# Altium footprint library ZJUDancer_Circuit_V3.6.3.PcbLib: 35 footprints (part 2 of 3)
Each footprint in its own frame and in the unit in brackets; x right, y up, seen from the top. Pads: shape width x height; smd on the part's side, far side on the other; paste and mask are expansions set on the pad; w line width, h text height; cw(c..) or ccw(c..) is an arc to the next point about the centre after c.
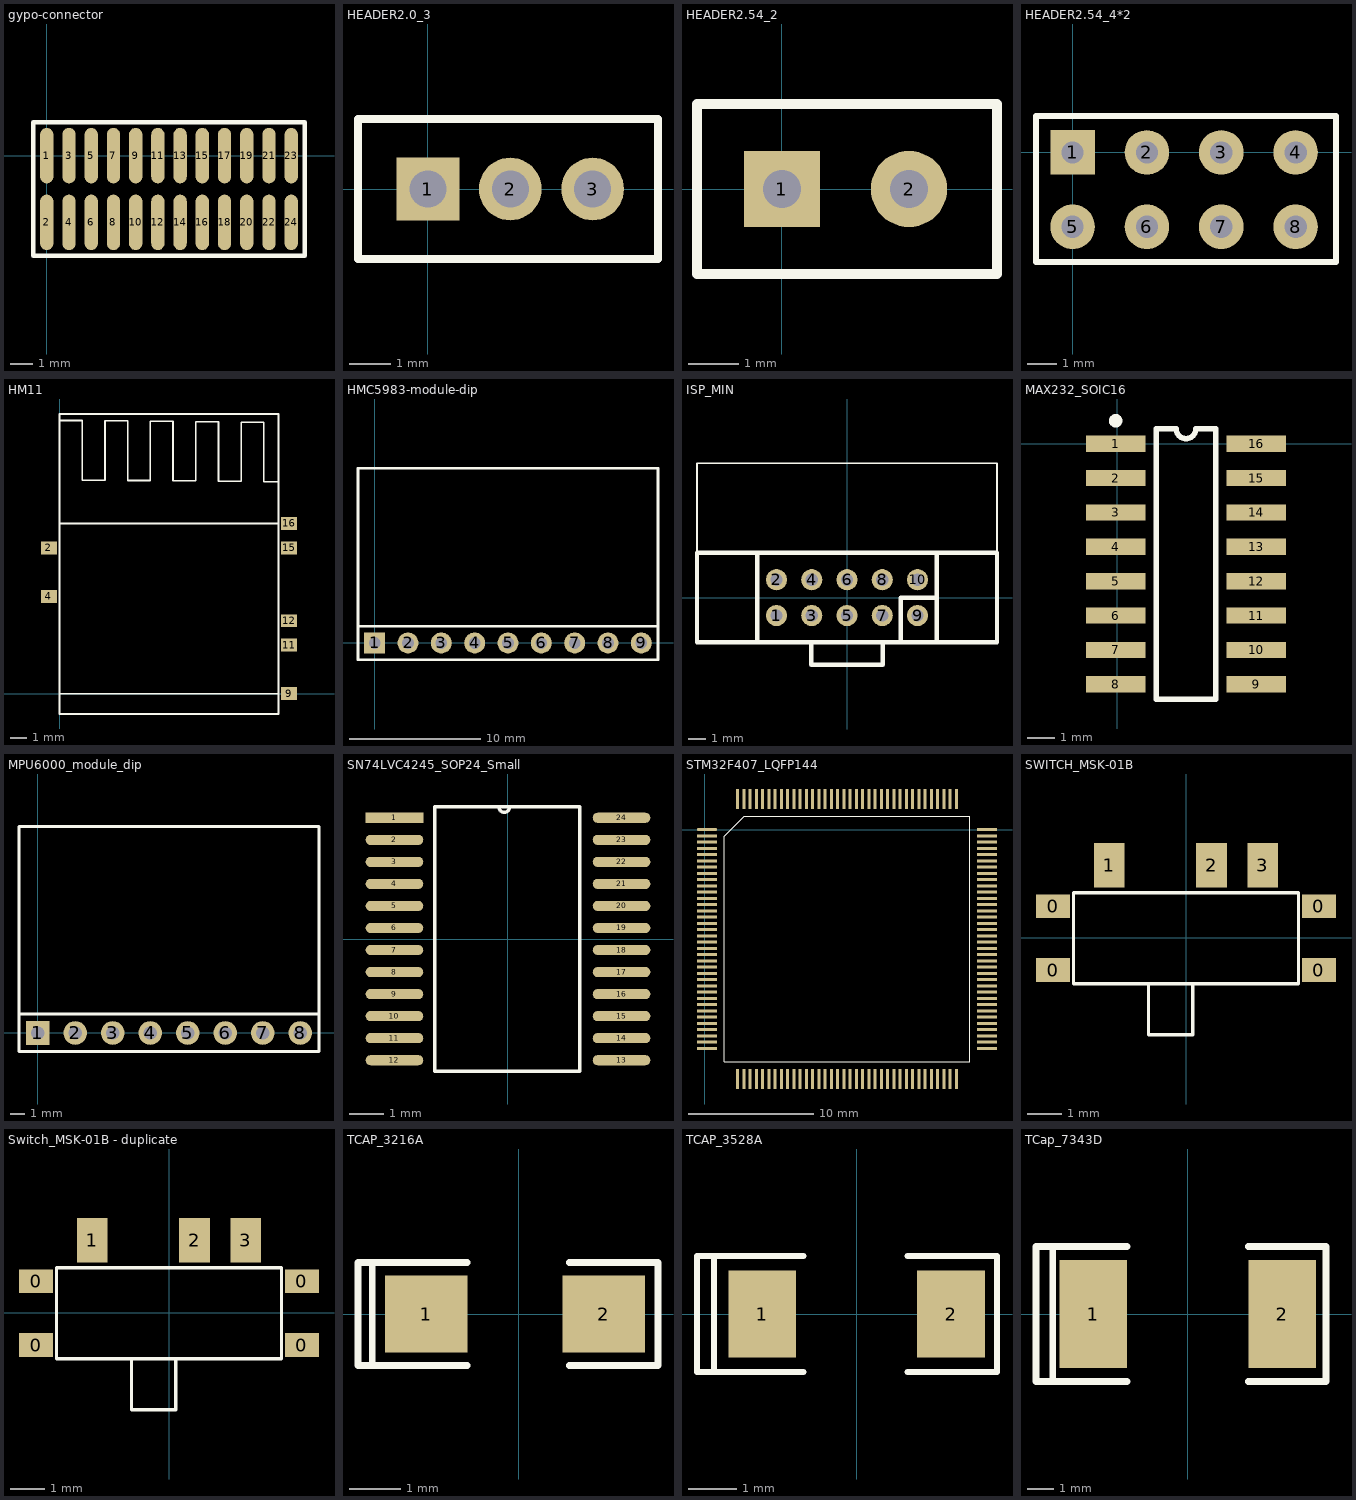
[diagram p1: the footprints below, top view; thin cyan lines are the x and y axes]

## gypo-connector [mm]
pads (24):
  oval 0.6x2.5 smd: 1(0,0) 2(0,-3) 3(1,0) 4(1,-3) 5(2,0) 6(2,-3) 7(3,0) 8(3,-3) 9(4,0) 10(4,-3) 11(5,0) 12(5,-3) 13(6,0) 14(6,-3) 15(7,0) 16(7,-3) 17(8,0) 18(8,-3) 19(9,0) 20(9,-3) 21(10,0) 22(10,-3) 23(11,0) 24(11,-3)
Top Overlay:
  lines w0.2: -0.6,-4.5 11.6,-4.5 11.6,1.5 -0.6,1.5 -0.6,-4.5

## HEADER2.0_3 [mil]
pads (3):
  rect 60x60 hole 35.43: 1(0,0)
  round 60 hole 35.43: 2(78.74,0) 3(157.48,0)
Top Overlay:
  lines w7.87: -66.93,-66.93 -66.93,66.93 220,66.93 220,-66.93 -66.93,-66.93

## HEADER2.54_2 [mil]
pads (2):
  rect 60x60 hole 30: 1(0,0)
  round 60 hole 30: 2(100,0)
Top Overlay:
  lines w7.87: -66.93,-66.93 169.29,-66.93 169.29,66.93 -66.93,66.93 -66.93,-66.93

## HEADER2.54_4*2 [mil]
pads (8):
  rect 60x60 hole 30: 1(0,0)
  round 60 hole 30: 2(100,0) 3(200,0) 4(300,0) 5(0,-100) 6(100,-100) 7(200,-100) 8(300,-100)
Top Overlay:
  lines w7.87: -49.21,-147.64 354.33,-147.64 354.33,49.21 344.49,49.21 -49.21,49.21 -49.21,-147.64

## HM11 [mm]
pads (7):
  rect 1x0.8 smd: 2(-0.65,9) 4(-0.65,6) 9(14.15,0) 11(14.15,3) 12(14.15,4.5) 15(14.15,9) 16(14.15,10.5)
Top Overlay:
  lines w0.1: 0,10.5 13.5,10.5 ; 0,16.85 1.4,16.85 1.4,13.175 2.8,13.175 2.8,16.825 4.2,16.825 4.2,13.15 5.6,13.15 5.6,16.8 7,16.8 7,13.125 8.4,13.125 8.4,16.775 9.8,16.775 9.8,13.1 11.2,13.1 11.2,16.75 12.6,16.75 12.6,13.075 13.5,13.075 ; 13.5,0 0,0 ; 0,0 0,17.25 13.5,17.25 13.5,-1.25 0,-1.25 0,0
3D body: height 1.63, standoff 0.02, extent 0,-1.25 13.5,17.25

## HMC5983-module-dip [mm]
pads (9):
  rect 1.6x1.6 hole 0.9: 1(0,0)
  round 1.6 hole 0.9: 2(2.54,0) 3(5.08,0) 4(7.62,0) 5(10.16,0) 6(12.7,0) 7(15.24,0) 8(17.78,0) 9(20.32,0)
Top Overlay:
  lines w0.2: -1.27,1.27 -1.27,13.3 21.59,13.3 21.59,1.27 ; -1.27,1.27 21.59,1.27 ; -1.27,1.27 -1.27,-1.27 21.59,-1.27 21.59,1.27

## ISP_MIN [mm]
pads (10):
  round 1.2 hole 0.7: 1(-4,-1.016) 2(-4,1.016) 3(-2,-1.016) 4(-2,1.016) 5(0,-1.016) 6(0,1.016) 7(2,-1.016) 8(2,1.016) 9(4,-1.016) 10(4,1.016)
Top Overlay:
  lines w0.1: -8.509,2.54 -8.509,7.625 8.509,7.625 8.509,2.54
  lines w0.254: -5.08,-2.54 -5.08,2.54 ; -2.032,-2.54 -2.032,-3.81 2.032,-3.81 2.032,-2.54 ; 3.048,-2.54 3.048,0 5.08,0 ; 5.08,-2.54 5.08,2.54 ; -8.509,-2.54 -8.509,2.54 8.509,2.54 8.509,-2.54 -8.509,-2.54
3D body: height 5.42, standoff -2.68, extent -8.605,-1.223 8.595,7.627

## MAX232_SOIC16 [mm]
pads (16):
  rect 2.2x0.6 smd: 1(-0.06,0) 2(-0.06,-1.27) 3(-0.06,-2.54) 4(-0.06,-3.81) 5(-0.06,-5.08) 6(-0.06,-6.35) 7(-0.06,-7.62) 8(-0.06,-8.89) 9(5.14,-8.89) 10(5.14,-7.62) 11(5.14,-6.35) 12(5.14,-5.08) 13(5.14,-3.81) 14(5.14,-2.54) 15(5.14,-1.27) 16(5.14,0)
Top Overlay:
  circle w0.25: c-0.06,0.85 r0.125
  lines w0.2: 1.44,-9.445 3.64,-9.445 3.64,0.555 2.907,0.555 cw(c2.54,0.555) 2.173,0.555 1.44,0.555 1.44,-9.445
3D body: height 1.64, standoff -0.01, extent -0.449,-9.396 5.551,0.504

## MPU6000_module_dip [mm]
pads (8):
  rect 1.6x1.6 hole 0.9: 1(0,0)
  round 1.6 hole 0.9: 2(2.54,0) 3(5.08,0) 4(7.62,0) 5(10.16,0) 6(12.7,0) 7(15.24,0) 8(17.78,0)
Top Overlay:
  lines w0.2: -1.27,1.27 19.05,1.27 ; -1.27,1.27 -1.27,-1.27 19.05,-1.27 19.05,1.27 ; -1.27,1.27 -1.27,14 19.05,14 19.05,1.27

## SN74LVC4245_SOP24_Small [mm]
pads (24):
  rect 1.7x0.3 smd: 1(-3.35,3.575)
  oval 1.7x0.3 smd: 2(-3.35,2.925) 3(-3.35,2.275) 4(-3.35,1.625) 5(-3.35,0.975) 6(-3.35,0.325) 7(-3.35,-0.325) 8(-3.35,-0.975) 9(-3.35,-1.625) 10(-3.35,-2.275) 11(-3.35,-2.925) 12(-3.35,-3.575) 13(3.35,-3.575) 14(3.35,-2.925) 15(3.35,-2.275) 16(3.35,-1.625) 17(3.35,-0.975) 18(3.35,-0.325) 19(3.35,0.325) 20(3.35,0.975) 21(3.35,1.625) 22(3.35,2.275) 23(3.35,2.925) 24(3.35,3.575)
Top Overlay:
  lines w0.1: -0.272,3.899 ccw(c-0.11,3.9) 0.053,3.9 ; -2.16,-3.9 2.12,-3.9 2.12,3.9 -2.16,3.9 -2.16,-3.9
3D body: height 0.95, standoff 0, extent -3.21,-3.905 3.19,3.895

## STM32F407_LQFP144 [mm]
pads (144):
  oval 1.6x0.254 smd: 1(0.2,0)
  rect 1.6x0.254 smd: 2(0.2,-0.5) 3(0.2,-1) 4(0.2,-1.5) 5(0.2,-2) 6(0.2,-2.5) 7(0.2,-3) 8(0.2,-3.5) 9(0.2,-4) 10(0.2,-4.5) 11(0.2,-5) 12(0.2,-5.5) 13(0.2,-6) 14(0.2,-6.5) 15(0.2,-7) 16(0.2,-7.5) 17(0.2,-8) 18(0.2,-8.5) 19(0.2,-9) 20(0.2,-9.5) 21(0.2,-10) 22(0.2,-10.5) 23(0.2,-11) 24(0.2,-11.5) 25(0.2,-12) 26(0.2,-12.5) 27(0.2,-13) 28(0.2,-13.5) 29(0.2,-14) 30(0.2,-14.5) 31(0.2,-15) 32(0.2,-15.5) 33(0.2,-16) 34(0.2,-16.5) 35(0.2,-17) 36(0.2,-17.5) 73(22.6,-17.5) 74(22.6,-17) 75(22.6,-16.5) 76(22.6,-16) 77(22.6,-15.5) 78(22.6,-15) 79(22.6,-14.5) 80(22.6,-14) 81(22.6,-13.5) 82(22.6,-13) 83(22.6,-12.5) 84(22.6,-12) 85(22.6,-11.5) 86(22.6,-11) 87(22.6,-10.5) 88(22.6,-10) 89(22.6,-9.5) 90(22.6,-9) 91(22.6,-8.5) 92(22.6,-8) 93(22.6,-7.5) 94(22.6,-7) 95(22.6,-6.5) 96(22.6,-6) 97(22.6,-5.5) 98(22.6,-5) 99(22.6,-4.5) 100(22.6,-4) 101(22.6,-3.5) 102(22.6,-3) 103(22.6,-2.5) 104(22.6,-2) 105(22.6,-1.5) 106(22.6,-1) 107(22.6,-0.5) 108(22.6,0)
  rect 0.254x1.6 smd: 37(2.65,-19.95) 38(3.15,-19.95) 39(3.65,-19.95) 40(4.15,-19.95) 41(4.65,-19.95) 42(5.15,-19.95) 43(5.65,-19.95) 44(6.15,-19.95) 45(6.65,-19.95) 46(7.15,-19.95) 47(7.65,-19.95) 48(8.15,-19.95) 49(8.65,-19.95) 50(9.15,-19.95) 51(9.65,-19.95) 52(10.15,-19.95) 53(10.65,-19.95) 54(11.15,-19.95) 55(11.65,-19.95) 56(12.15,-19.95) 57(12.65,-19.95) 58(13.15,-19.95) 59(13.65,-19.95) 60(14.15,-19.95) 61(14.65,-19.95) 62(15.15,-19.95) 63(15.65,-19.95) 64(16.15,-19.95) 65(16.65,-19.95) 66(17.15,-19.95) 67(17.65,-19.95) 68(18.15,-19.95) 69(18.65,-19.95) 70(19.15,-19.95) 71(19.65,-19.95) 72(20.15,-19.95) 109(20.15,2.45) 110(19.65,2.45) 111(19.15,2.45) 112(18.65,2.45) 113(18.15,2.45) 114(17.65,2.45) 115(17.15,2.45) 116(16.65,2.45) 117(16.15,2.45) 118(15.65,2.45) 119(15.15,2.45) 120(14.65,2.45) 121(14.15,2.45) 122(13.65,2.45) 123(13.15,2.45) 124(12.65,2.45) 125(12.15,2.45) 126(11.65,2.45) 127(11.15,2.45) 128(10.65,2.45) 129(10.15,2.45) 130(9.65,2.45) 131(9.15,2.45) 132(8.65,2.45) 133(8.15,2.45) 134(7.65,2.45) 135(7.15,2.45) 136(6.65,2.45) 137(6.15,2.45) 138(5.65,2.45) 139(5.15,2.45) 140(4.65,2.45) 141(4.15,2.45) 142(3.65,2.45) 143(3.15,2.45) 144(2.65,2.45)
Top Overlay:
  lines w0.1: 1.585,-18.565 21.215,-18.565 21.215,1.065 3.17,1.065 1.585,-0.52 1.585,-18.565
3D body: height 1.5, standoff 0, extent 0.4,-19.75 22.4,2.25

## SWITCH_MSK-01B [mm]
pads (7):
  rect 1x0.7 smd: 0(-3.9,-0.948) 0(-3.9,0.923) 0(3.9,-0.948) 0(3.9,0.923)
  rect 0.9x1.3 smd: 1(-2.25,2.127) 2(0.75,2.127) 3(2.25,2.127)
Top Overlay:
  lines w0.1: -1.1,-1.35 -1.1,-2.85 0.2,-2.85 0.2,-1.35 ; -3.3,-1.35 3.3,-1.35 3.3,1.325 -3.3,1.325 -3.3,-1.35
3D body: height 1.42, standoff -0.48, extent -3.9,-2.85 3.9,2.35

## Switch_MSK-01B - duplicate [mm]
pads (7):
  rect 1x0.7 smd: 0(-3.9,-0.948) 0(-3.9,0.923) 0(3.9,-0.948) 0(3.9,0.923)
  rect 0.9x1.3 smd: 1(-2.25,2.127) 2(0.75,2.127) 3(2.25,2.127)
Top Overlay:
  lines w0.1: -1.1,-1.35 -1.1,-2.85 0.2,-2.85 0.2,-1.35 ; -3.3,-1.35 -3.3,1.325 3.3,1.325 3.3,-1.35 -3.3,-1.35
3D body: height 1.42, standoff -0.48, extent -3.9,-2.85 3.9,2.35

## TCAP_3216A [mm]
pads (2):
  rect 1.6x1.5 smd: 1(-1.8,0) 2(1.65,0)
Top Overlay:
  lines w0.127: -1,-1 -2.85,-1 ; -1,1 -2.85,1 ; 0.975,-1 2.7,-1 2.7,1 0.975,1 ; -2.85,-1 -3.125,-1 -3.125,1 -2.85,1 ; -2.85,-1 -2.85,1
3D body: height 1.6, standoff -0.05, extent -1.65,-0.8 1.65,0.8

## TCAP_3528A [mm]
pads (2):
  rect 1.4x1.8 smd: 1(-1.95,0) 2(1.95,0)
Top Overlay:
  lines w0.127: -1.1,-1.2 -2.95,-1.2 ; -1.1,1.2 -2.95,1.2 ; 1.05,-1.2 2.9,-1.2 2.9,1.2 1.05,1.2 ; -2.95,-1.2 -2.95,1.2 ; -2.95,-1.2 -3.3,-1.2 -3.3,1.2 -2.95,1.2
3D body: height 1.8, standoff -0.05, extent -1.8,-1.4 1.8,1.4

## TCap_7343D [mil]
pads (2):
  rect 100x160 smd: 1(-140,0) 2(140,0)
Top Overlay:
  lines w10: -200,-100 -200,100 ; -90,-100 -225,-100 -225,100 -90,100 ; 90,-100 205,-100 205,0 205,100 90,100